# Altium schematic symbol library LATTICEPLDS_Library.SchLib: 291 symbols (part 22 of 32) (continued)
## LFEC1/3/6-T144/TN144 (continued)
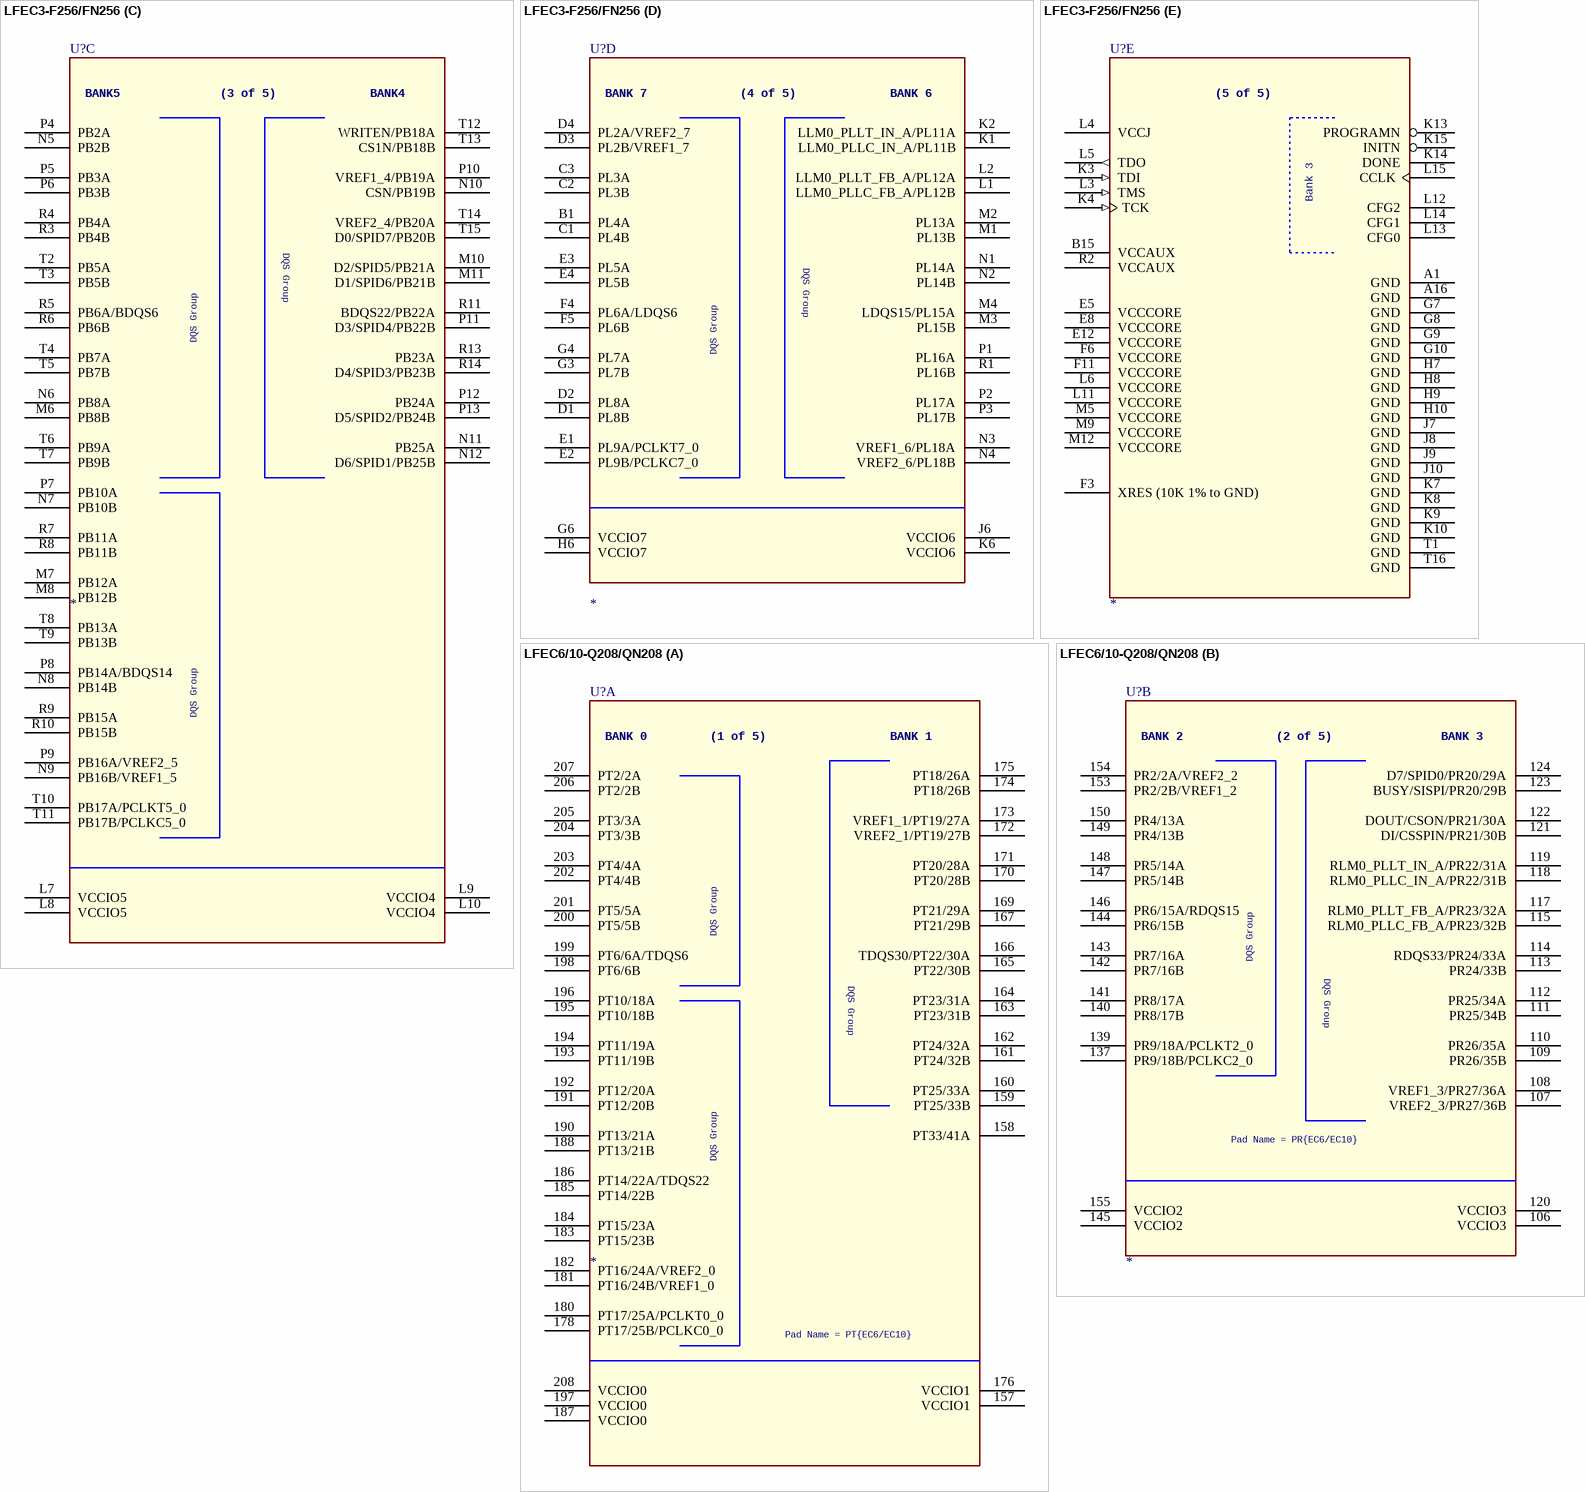
[diagram p208: symbols LFEC3-F256/FN256 to LFEC6/10-Q208/QN208]
part A text: BANK 0; (1 OF 5); BANK 1; Pad name = PT{EC1/EC3/EC6}
part B text: BANK 2; (2 OF 5); BANK 3; Pad name = PR{EC1/EC3/EC6}
part C text: BANK 5; (3 OF 5); BANK 4; Pad name = PB{EC1/EC3/EC6}
part D text: BANK 7; (4 OF 5); BANK 6; Pad name = PL{EC1/EC3/EC6}
part E text: (5 OF 5); Bank 3; 11 and 12 are N/C for EC1 and EC3

## LFEC3-F256/FN256
designator U?
footprint fpBGA256
part A pins: A2 PT5A, A3 PT5B, A4 PT6A/TDQS6, A5 PT6B, A6 PT10A, A7 PT10B, A8 PT13A, A9 PT13B, A10 PT17B/PCLKC0_0, A11 PT18B, A12 VREF2_1/PT19B, A13 PT21A, A14 PT21B, A15 PT24B, B2 PT4B, B3 PT4A, B4 PT2A, B5 PT7A, B6 PT7B, B7 PT12A, B8 PT12B, B9 PT16A/VREF2_0, B10 PT17A/PCLKT0_0, B11 PT18A, B12 VREF1_1/PT19A, B14 PT24A, C4 PT2B, C5 PT3A, C6 PT8A, C7 PT11A, C8 PT14A/TDQS14, C9 PT16B/VREF1_0, C10 PT20A, C11 PT23A, C12 PT25B, D5 PT3B, D6 PT8B, D7 PT11B, D8 PT14B, D9 PT15A, D10 PT20B, D11 PT23B, D12 PT25A, E6 PT9A, E7 PT9B, E9 PT15B, E10 PT22B, E11 TDQS22/PT22A, F7 VCCIO0 (power), F8 VCCIO0 (power), F9 VCCIO1 (power), F10 VCCIO1 (power)
part B pins: B16 PR4A, C14 PR3A, C15 PR3B, C16 PR4B, D13 PR2A/VREF2_2, D14 PR2B/VREF1_2, D15 PR6A/RDQS6, D16 PR6B, E13 PR7A, E14 PR5A, F12 PR7B, F13 PR8A, F14 PR5B, G11 VCCIO2 (power), G12 PR9A/PCLKT2_0, G13 PR8B, H11 VCCIO2 (power), H12 PR9B/PCLKC2_0, J11 VCCIO3 (power), J16 D7/SPID0/PR11A, K11 VCCIO3 (power), K16 BUSY/SISPI/PR11B, L16 DOUT/CSON/PR12A, M13 PR15B, M14 RDQS15/PR15A, M15 RLM0_PLLT_IN_A/PR13A, M16 DI/CSSPIN/PR12B, N13 VREF2_3/PR18B, N14 VREF1_3/PR18A, N15 RLM0_PLLC_IN_A/PR13B, N16 RLM0_PLLT_FB_A/PR14A, P14 PR17B, P15 PR17A, P16 RLM0_PLLC_FB_A/PR14B, R15 PR16B, R16 PR16A
part C pins: L7 VCCIO5 (power), L8 VCCIO5 (power), L9 VCCIO4 (power), L10 VCCIO4 (power), M6 PB8B, M7 PB12A, M8 PB12B, M10 D2/SPID5/PB21A, M11 D1/SPID6/PB21B, N5 PB2B, N6 PB8A, N7 PB10B, N8 PB14B, N9 PB16B/VREF1_5, N10 CSN/PB19B, N11 PB25A, N12 D6/SPID1/PB25B, P4 PB2A, P5 PB3A, P6 PB3B, P7 PB10A, P8 PB14A/BDQS14, P9 PB16A/VREF2_5, P10 VREF1_4/PB19A, P11 D3/SPID4/PB22B, P12 PB24A, P13 D5/SPID2/PB24B, R3 PB4B, R4 PB4A, R5 PB6A/BDQS6, R6 PB6B, R7 PB11A, R8 PB11B, R9 PB15A, R10 PB15B, R11 BDQS22/PB22A, R13 PB23A, R14 D4/SPID3/PB23B, T2 PB5A, T3 PB5B, T4 PB7A, T5 PB7B, T6 PB9A, T7 PB9B, T8 PB13A, T9 PB13B, T10 PB17A/PCLKT5_0, T11 PB17B/PCLKC5_0, T12 WRITEN/PB18A, T13 CS1N/PB18B, T14 VREF2_4/PB20A, T15 D0/SPID7/PB20B
part D pins: B1 PL4A, C1 PL4B, C2 PL3B, C3 PL3A, D1 PL8B, D2 PL8A, D3 PL2B/VREF1_7, D4 PL2A/VREF2_7, E1 PL9A/PCLKT7_0, E2 PL9B/PCLKC7_0, E3 PL5A, E4 PL5B, F4 PL6A/LDQS6, F5 PL6B, G3 PL7B, G4 PL7A, G6 VCCIO7 (power), H6 VCCIO7 (power), J6 VCCIO6 (power), K1 LLM0_PLLC_IN_A/PL11B, K2 LLM0_PLLT_IN_A/PL11A, K6 VCCIO6 (power), L1 LLM0_PLLC_FB_A/PL12B, L2 LLM0_PLLT_FB_A/PL12A, M1 PL13B, M2 PL13A, M3 PL15B, M4 LDQS15/PL15A, N1 PL14A, N2 PL14B, N3 VREF1_6/PL18A, N4 VREF2_6/PL18B, P1 PL16A, P2 PL17A, P3 PL17B, R1 PL16B
part E pins: A1 GND (power), A16 GND (power), B15 VCCAUX (power), E5 VCCCORE (power), E8 VCCCORE (power), E12 VCCCORE (power), F3 XRES (10K 1% to GND), F6 VCCCORE (power), F11 VCCCORE (power), G7 GND (power), G8 GND (power), G9 GND (power), G10 GND (power), H7 GND (power), H8 GND (power), H9 GND (power), H10 GND (power), J7 GND (power), J8 GND (power), J9 GND (power), J10 GND (power), K3 TDI (in), K4 TCK (in), K7 GND (power), K8 GND (power), K9 GND (power), K10 GND (power), K13 PROGRAMN, K14 DONE, K15 INITN, L3 TMS (in), L4 VCCJ (power), L5 TDO (out), L6 VCCCORE (power), L11 VCCCORE (power), L12 CFG2, L13 CFG0, L14 CFG1, L15 CCLK, M5 VCCCORE (power), M9 VCCCORE (power), M12 VCCCORE (power), R2 VCCAUX (power), T1 GND (power), T16 GND (power)
part A text: BANK 0; (1 of 5); BANK 1; DQS Group
part B text: BANK 2; (2 of 5); BANK 3; DQS Group
part C text: BANK5; (3 of 5); BANK4; DQS Group
part D text: BANK 7; (4 of 5); BANK 6; DQS Group
part E text: (5 of 5); Bank 3

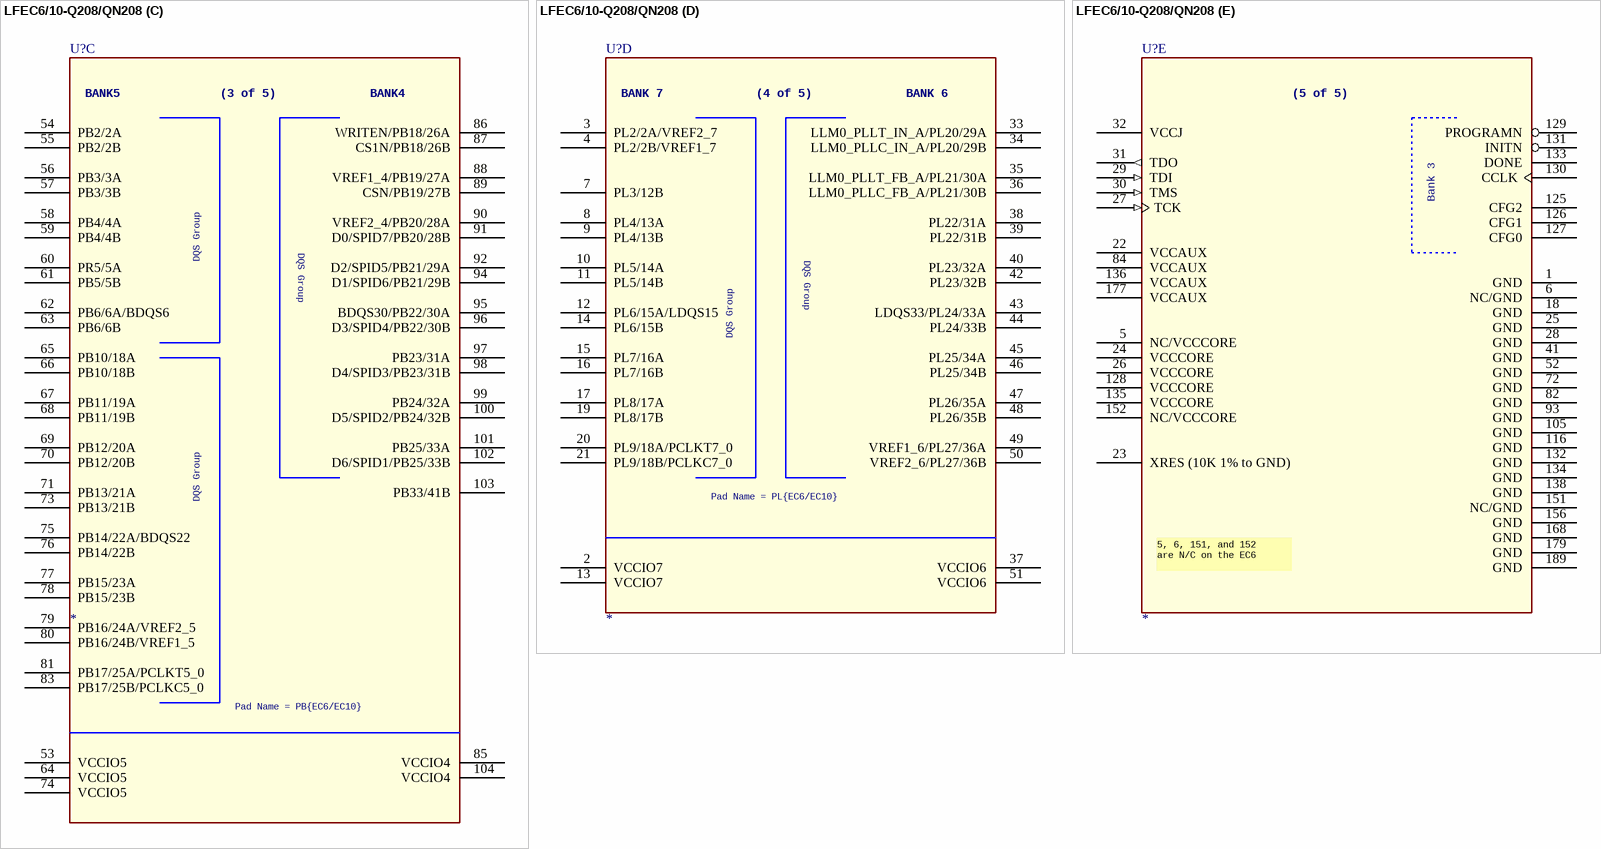
[diagram p209: symbol LFEC6/10-Q208/QN208]

## LFEC6/10-Q208/QN208
designator U?
footprint 208PQFP
part A pins: 157 VCCIO1 (power), 158 PT33/41A, 159 PT25/33B, 160 PT25/33A, 161 PT24/32B, 162 PT24/32A, 163 PT23/31B, 164 PT23/31A, 165 PT22/30B, 166 TDQS30/PT22/30A, 167 PT21/29B, 169 PT21/29A, 170 PT20/28B, 171 PT20/28A, 172 VREF2_1/PT19/27B, 173 VREF1_1/PT19/27A, 174 PT18/26B, 175 PT18/26A, 176 VCCIO1 (power), 178 PT17/25B/PCLKC0_0, 180 PT17/25A/PCLKT0_0, 181 PT16/24B/VREF1_0, 182 PT16/24A/VREF2_0, 183 PT15/23B, 184 PT15/23A, 185 PT14/22B, 186 PT14/22A/TDQS22, 187 VCCIO0 (power), 188 PT13/21B, 190 PT13/21A, 191 PT12/20B, 192 PT12/20A, 193 PT11/19B, 194 PT11/19A, 195 PT10/18B, 196 PT10/18A, 197 VCCIO0 (power), 198 PT6/6B, 199 PT6/6A/TDQS6, 200 PT5/5B, 201 PT5/5A, 202 PT4/4B, 203 PT4/4A, 204 PT3/3B, 205 PT3/3A, 206 PT2/2B, 207 PT2/2A, 208 VCCIO0 (power)
part B pins: 106 VCCIO3 (power), 107 VREF2_3/PR27/36B, 108 VREF1_3/PR27/36A, 109 PR26/35B, 110 PR26/35A, 111 PR25/34B, 112 PR25/34A, 113 PR24/33B, 114 RDQS33/PR24/33A, 115 RLM0_PLLC_FB_A/PR23/32B, 117 RLM0_PLLT_FB_A/PR23/32A, 118 RLM0_PLLC_IN_A/PR22/31B, 119 RLM0_PLLT_IN_A/PR22/31A, 120 VCCIO3 (power), 121 DI/CSSPIN/PR21/30B, 122 DOUT/CSON/PR21/30A, 123 BUSY/SISPI/PR20/29B, 124 D7/SPID0/PR20/29A, 137 PR9/18B/PCLKC2_0, 139 PR9/18A/PCLKT2_0, 140 PR8/17B, 141 PR8/17A, 142 PR7/16B, 143 PR7/16A, 144 PR6/15B, 145 VCCIO2 (power), 146 PR6/15A/RDQS15, 147 PR5/14B, 148 PR5/14A, 149 PR4/13B, 150 PR4/13A, 153 PR2/2B/VREF1_2, 154 PR2/2A/VREF2_2, 155 VCCIO2 (power)
part C pins: 53 VCCIO5 (power), 54 PB2/2A, 55 PB2/2B, 56 PB3/3A, 57 PB3/3B, 58 PB4/4A, 59 PB4/4B, 60 PR5/5A, 61 PB5/5B, 62 PB6/6A/BDQS6, 63 PB6/6B, 64 VCCIO5 (power), 65 PB10/18A, 66 PB10/18B, 67 PB11/19A, 68 PB11/19B, 69 PB12/20A, 70 PB12/20B, 71 PB13/21A, 73 PB13/21B, 74 VCCIO5 (power), 75 PB14/22A/BDQS22, 76 PB14/22B, 77 PB15/23A, 78 PB15/23B, 79 PB16/24A/VREF2_5, 80 PB16/24B/VREF1_5, 81 PB17/25A/PCLKT5_0, 83 PB17/25B/PCLKC5_0, 85 VCCIO4 (power), 86 WRITEN/PB18/26A, 87 CS1N/PB18/26B, 88 VREF1_4/PB19/27A, 89 CSN/PB19/27B, 90 VREF2_4/PB20/28A, 91 D0/SPID7/PB20/28B, 92 D2/SPID5/PB21/29A, 94 D1/SPID6/PB21/29B, 95 BDQS30/PB22/30A, 96 D3/SPID4/PB22/30B, 97 PB23/31A, 98 D4/SPID3/PB23/31B, 99 PB24/32A, 100 D5/SPID2/PB24/32B, 101 PB25/33A, 102 D6/SPID1/PB25/33B, 103 PB33/41B, 104 VCCIO4 (power)
part D pins: 2 VCCIO7 (power), 3 PL2/2A/VREF2_7, 4 PL2/2B/VREF1_7, 7 PL3/12B, 8 PL4/13A, 9 PL4/13B, 10 PL5/14A, 11 PL5/14B, 12 PL6/15A/LDQS15, 13 VCCIO7 (power), 14 PL6/15B, 15 PL7/16A, 16 PL7/16B, 17 PL8/17A, 19 PL8/17B, 20 PL9/18A/PCLKT7_0, 21 PL9/18B/PCLKC7_0, 33 LLM0_PLLT_IN_A/PL20/29A, 34 LLM0_PLLC_IN_A/PL20/29B, 35 LLM0_PLLT_FB_A/PL21/30A, 36 LLM0_PLLC_FB_A/PL21/30B, 37 VCCIO6 (power), 38 PL22/31A, 39 PL22/31B, 40 PL23/32A, 42 PL23/32B, 43 LDQS33/PL24/33A, 44 PL24/33B, 45 PL25/34A, 46 PL25/34B, 47 PL26/35A, 48 PL26/35B, 49 VREF1_6/PL27/36A, 50 VREF2_6/PL27/36B, 51 VCCIO6 (power)
part E pins: 1 GND (power), 5 NC/VCCCORE (power), 6 NC/GND (power), 18 GND (power), 22 VCCAUX (power), 23 XRES (10K 1% to GND), 24 VCCCORE (power), 25 GND (power), 26 VCCCORE (power), 27 TCK (in), 28 GND (power), 29 TDI (in), 30 TMS (in), 31 TDO (out), 32 VCCJ (power), 41 GND (power), 52 GND (power), 72 GND (power), 82 GND (power), 84 VCCAUX (power), 93 GND (power), 105 GND (power), 116 GND (power), 125 CFG2, 126 CFG1, 127 CFG0, 128 VCCCORE (power), 129 PROGRAMN, 130 CCLK, 131 INITN, 132 GND (power), 133 DONE, 134 GND (power), 135 VCCCORE (power), 136 VCCAUX (power), 138 GND (power), 151 NC/GND (power), 152 NC/VCCCORE (power), 156 GND (power), 168 GND (power), 177 VCCAUX (power), 179 GND (power), 189 GND (power)
part A text: BANK 0; (1 of 5); BANK 1; DQS Group; Pad Name = PT{EC6/EC10}
part B text: BANK 2; (2 of 5); BANK 3; DQS Group; Pad Name = PR{EC6/EC10}
part C text: BANK5; (3 of 5); BANK4; DQS Group; Pad Name = PB{EC6/EC10}
part D text: BANK 7; (4 of 5); BANK 6; DQS Group; Pad Name = PL{EC6/EC10}
part E text: (5 of 5); Bank 3; 5, 6, 151, and 152 / are N/C on the EC6

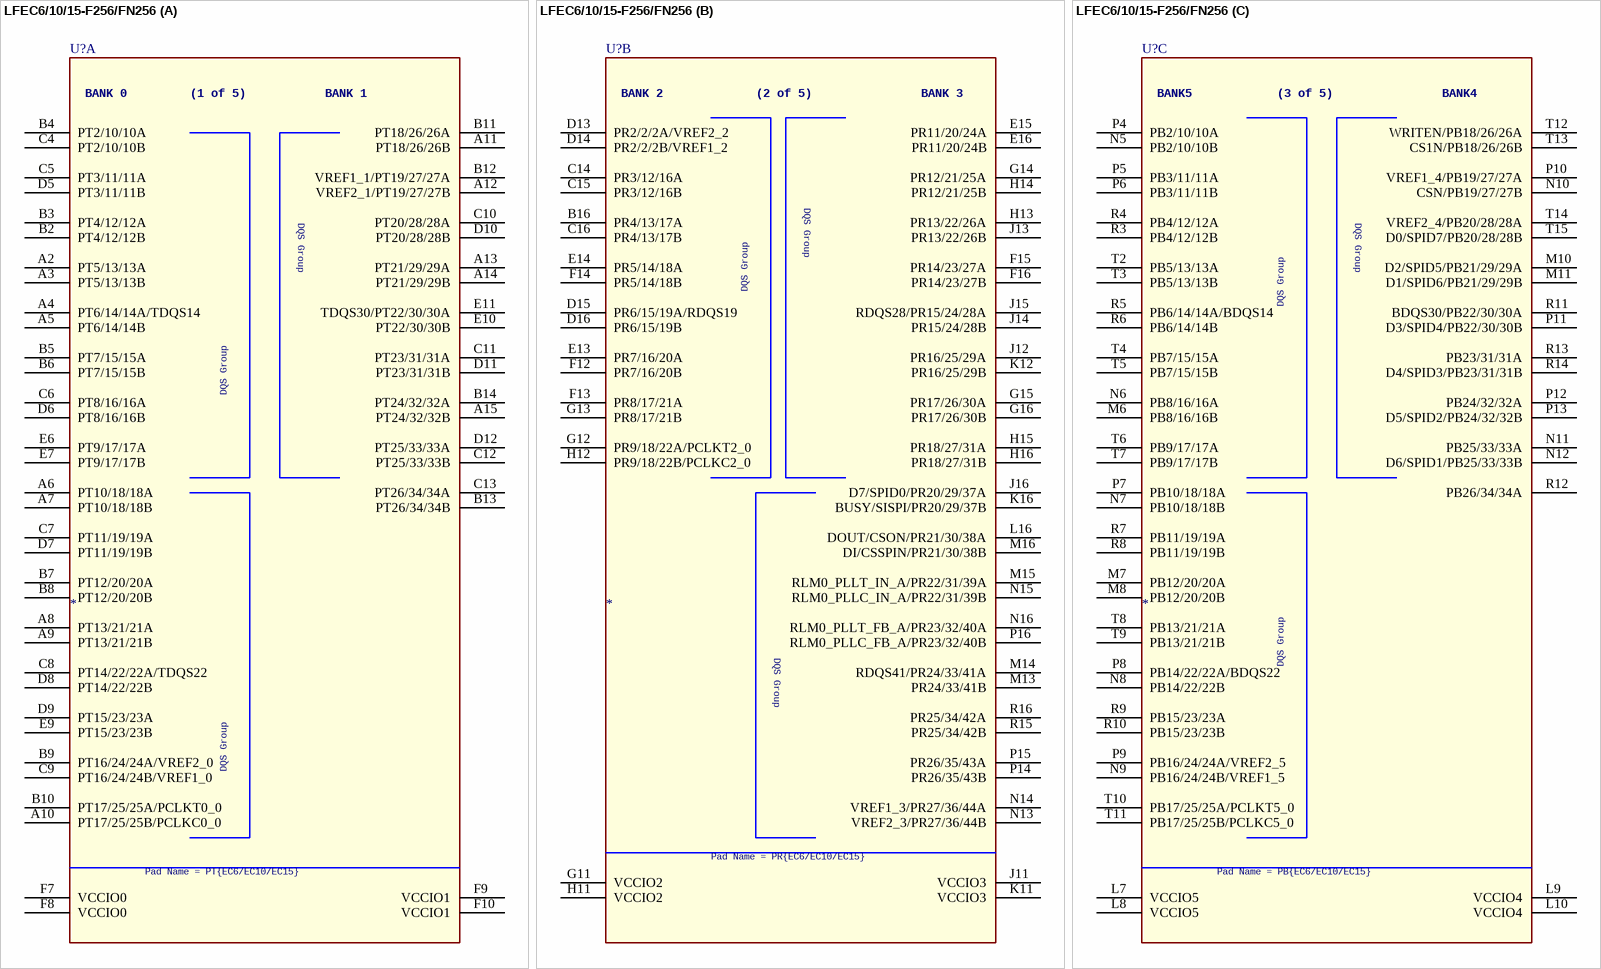
[diagram p210: symbol LFEC6/10/15-F256/FN256]

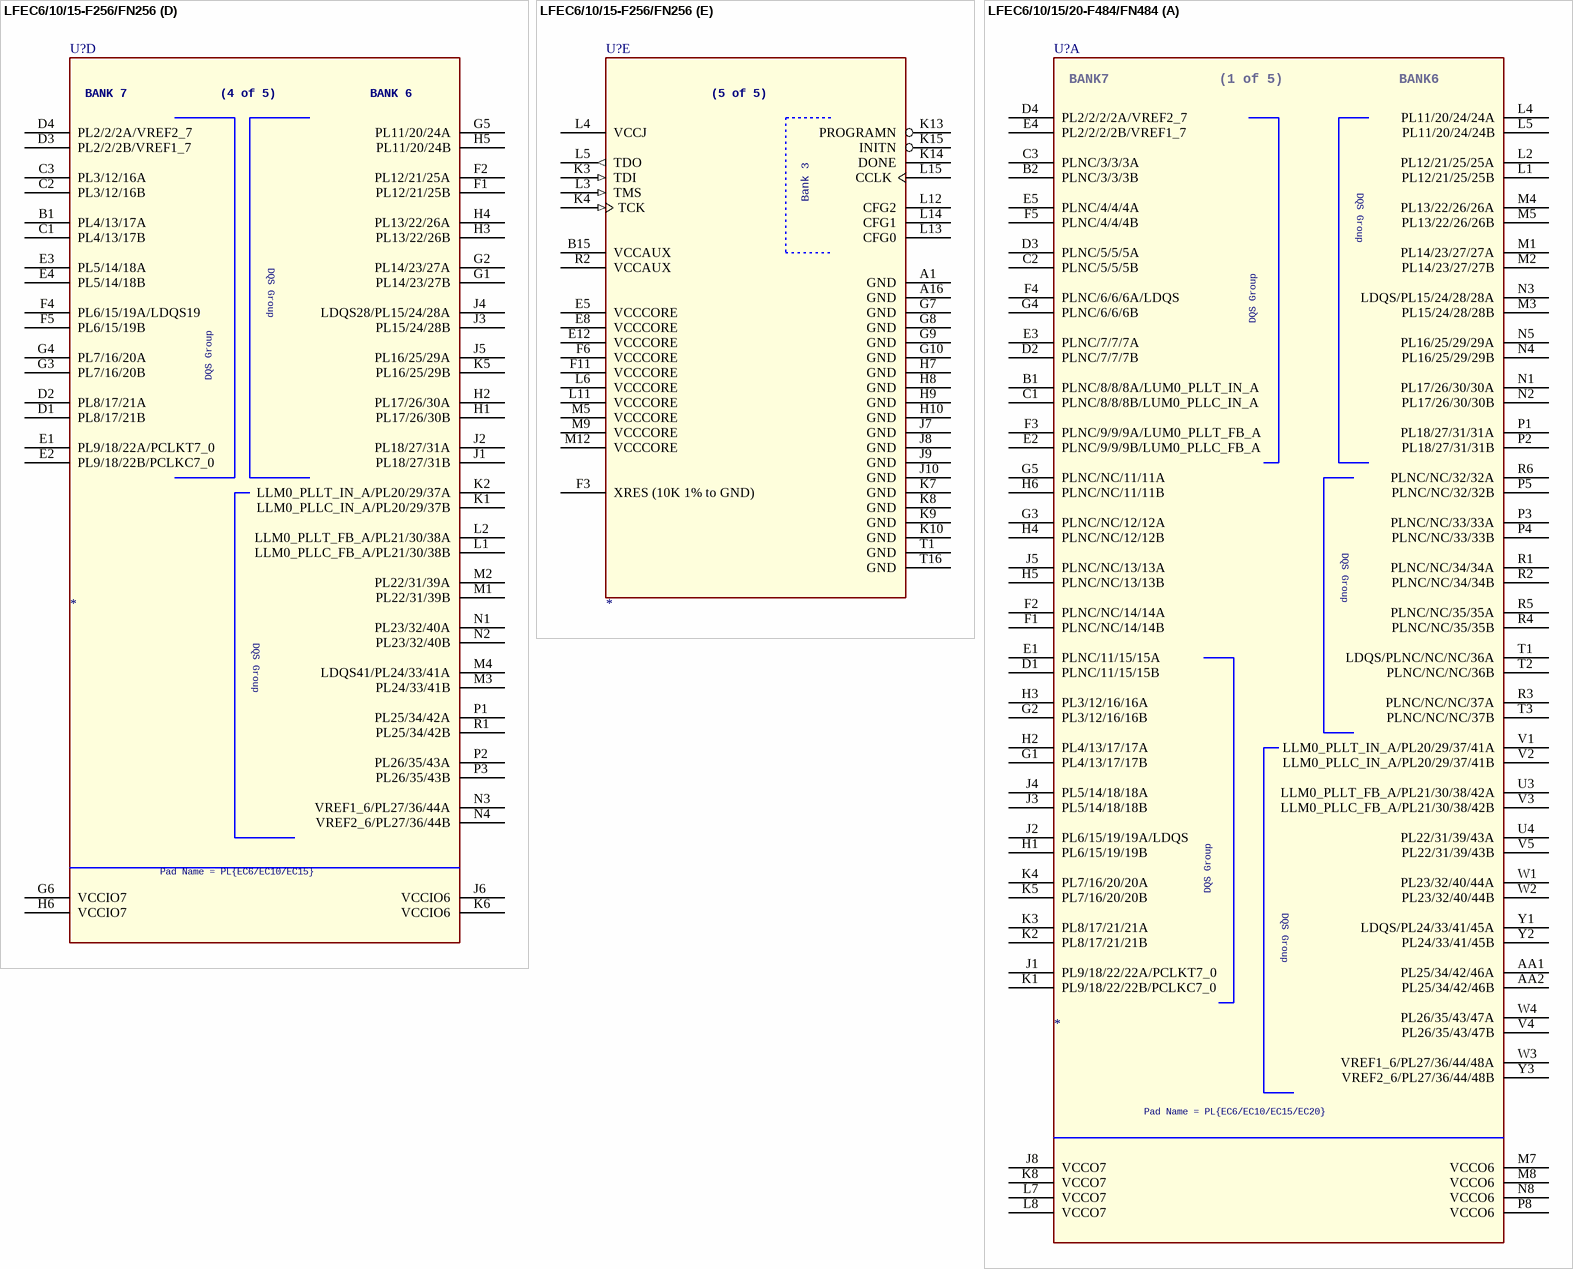
[diagram p211: symbols LFEC6/10/15-F256/FN256 to LFEC6/10/15/20-F484/FN484]

## LFEC6/10/15-F256/FN256
designator U?
footprint fpBGA256
part A pins: A2 PT5/13/13A, A3 PT5/13/13B, A4 PT6/14/14A/TDQS14, A5 PT6/14/14B, A6 PT10/18/18A, A7 PT10/18/18B, A8 PT13/21/21A, A9 PT13/21/21B, A10 PT17/25/25B/PCLKC0_0, A11 PT18/26/26B, A12 VREF2_1/PT19/27/27B, A13 PT21/29/29A, A14 PT21/29/29B, A15 PT24/32/32B, B2 PT4/12/12B, B3 PT4/12/12A, B4 PT2/10/10A, B5 PT7/15/15A, B6 PT7/15/15B, B7 PT12/20/20A, B8 PT12/20/20B, B9 PT16/24/24A/VREF2_0, B10 PT17/25/25A/PCLKT0_0, B11 PT18/26/26A, B12 VREF1_1/PT19/27/27A, B13 PT26/34/34B, B14 PT24/32/32A, C4 PT2/10/10B, C5 PT3/11/11A, C6 PT8/16/16A, C7 PT11/19/19A, C8 PT14/22/22A/TDQS22, C9 PT16/24/24B/VREF1_0, C10 PT20/28/28A, C11 PT23/31/31A, C12 PT25/33/33B, C13 PT26/34/34A, D5 PT3/11/11B, D6 PT8/16/16B, D7 PT11/19/19B, D8 PT14/22/22B, D9 PT15/23/23A, D10 PT20/28/28B, D11 PT23/31/31B, D12 PT25/33/33A, E6 PT9/17/17A, E7 PT9/17/17B, E9 PT15/23/23B, E10 PT22/30/30B, E11 TDQS30/PT22/30/30A, F7 VCCIO0 (power), F8 VCCIO0 (power), F9 VCCIO1 (power), F10 VCCIO1 (power)
part B pins: B16 PR4/13/17A, C14 PR3/12/16A, C15 PR3/12/16B, C16 PR4/13/17B, D13 PR2/2/2A/VREF2_2, D14 PR2/2/2B/VREF1_2, D15 PR6/15/19A/RDQS19, D16 PR6/15/19B, E13 PR7/16/20A, E14 PR5/14/18A, E15 PR11/20/24A, E16 PR11/20/24B, F12 PR7/16/20B, F13 PR8/17/21A, F14 PR5/14/18B, F15 PR14/23/27A, F16 PR14/23/27B, G11 VCCIO2 (power), G12 PR9/18/22A/PCLKT2_0, G13 PR8/17/21B, G14 PR12/21/25A, G15 PR17/26/30A, G16 PR17/26/30B, H11 VCCIO2 (power), H12 PR9/18/22B/PCLKC2_0, H13 PR13/22/26A, H14 PR12/21/25B, H15 PR18/27/31A, H16 PR18/27/31B, J11 VCCIO3 (power), J12 PR16/25/29A, J13 PR13/22/26B, J14 PR15/24/28B, J15 RDQS28/PR15/24/28A, J16 D7/SPID0/PR20/29/37A, K11 VCCIO3 (power), K12 PR16/25/29B, K16 BUSY/SISPI/PR20/29/37B, L16 DOUT/CSON/PR21/30/38A, M13 PR24/33/41B, M14 RDQS41/PR24/33/41A, M15 RLM0_PLLT_IN_A/PR22/31/39A, M16 DI/CSSPIN/PR21/30/38B, N13 VREF2_3/PR27/36/44B, N14 VREF1_3/PR27/36/44A, N15 RLM0_PLLC_IN_A/PR22/31/39B, N16 RLM0_PLLT_FB_A/PR23/32/40A, P14 PR26/35/43B, P15 PR26/35/43A, P16 RLM0_PLLC_FB_A/PR23/32/40B, R15 PR25/34/42B, R16 PR25/34/42A
part C pins: L7 VCCIO5 (power), L8 VCCIO5 (power), L9 VCCIO4 (power), L10 VCCIO4 (power), M6 PB8/16/16B, M7 PB12/20/20A, M8 PB12/20/20B, M10 D2/SPID5/PB21/29/29A, M11 D1/SPID6/PB21/29/29B, N5 PB2/10/10B, N6 PB8/16/16A, N7 PB10/18/18B, N8 PB14/22/22B, N9 PB16/24/24B/VREF1_5, N10 CSN/PB19/27/27B, N11 PB25/33/33A, N12 D6/SPID1/PB25/33/33B, P4 PB2/10/10A, P5 PB3/11/11A, P6 PB3/11/11B, P7 PB10/18/18A, P8 PB14/22/22A/BDQS22, P9 PB16/24/24A/VREF2_5, P10 VREF1_4/PB19/27/27A, P11 D3/SPID4/PB22/30/30B, P12 PB24/32/32A, P13 D5/SPID2/PB24/32/32B, R3 PB4/12/12B, R4 PB4/12/12A, R5 PB6/14/14A/BDQS14, R6 PB6/14/14B, R7 PB11/19/19A, R8 PB11/19/19B, R9 PB15/23/23A, R10 PB15/23/23B, R11 BDQS30/PB22/30/30A, R12 PB26/34/34A, R13 PB23/31/31A, R14 D4/SPID3/PB23/31/31B, T2 PB5/13/13A, T3 PB5/13/13B, T4 PB7/15/15A, T5 PB7/15/15B, T6 PB9/17/17A, T7 PB9/17/17B, T8 PB13/21/21A, T9 PB13/21/21B, T10 PB17/25/25A/PCLKT5_0, T11 PB17/25/25B/PCLKC5_0, T12 WRITEN/PB18/26/26A, T13 CS1N/PB18/26/26B, T14 VREF2_4/PB20/28/28A, T15 D0/SPID7/PB20/28/28B
part D pins: B1 PL4/13/17A, C1 PL4/13/17B, C2 PL3/12/16B, C3 PL3/12/16A, D1 PL8/17/21B, D2 PL8/17/21A, D3 PL2/2/2B/VREF1_7, D4 PL2/2/2A/VREF2_7, E1 PL9/18/22A/PCLKT7_0, E2 PL9/18/22B/PCLKC7_0, E3 PL5/14/18A, E4 PL5/14/18B, F1 PL12/21/25B, F2 PL12/21/25A, F4 PL6/15/19A/LDQS19, F5 PL6/15/19B, G1 PL14/23/27B, G2 PL14/23/27A, G3 PL7/16/20B, G4 PL7/16/20A, G5 PL11/20/24A, G6 VCCIO7 (power), H1 PL17/26/30B, H2 PL17/26/30A, H3 PL13/22/26B, H4 PL13/22/26A, H5 PL11/20/24B, H6 VCCIO7 (power), J1 PL18/27/31B, J2 PL18/27/31A, J3 PL15/24/28B, J4 LDQS28/PL15/24/28A, J5 PL16/25/29A, J6 VCCIO6 (power), K1 LLM0_PLLC_IN_A/PL20/29/37B, K2 LLM0_PLLT_IN_A/PL20/29/37A, K5 PL16/25/29B, K6 VCCIO6 (power), L1 LLM0_PLLC_FB_A/PL21/30/38B, L2 LLM0_PLLT_FB_A/PL21/30/38A, M1 PL22/31/39B, M2 PL22/31/39A, M3 PL24/33/41B, M4 LDQS41/PL24/33/41A, N1 PL23/32/40A, N2 PL23/32/40B, N3 VREF1_6/PL27/36/44A, N4 VREF2_6/PL27/36/44B, P1 PL25/34/42A, P2 PL26/35/43A, P3 PL26/35/43B, R1 PL25/34/42B
part E pins: A1 GND (power), A16 GND (power), B15 VCCAUX (power), E5 VCCCORE (power), E8 VCCCORE (power), E12 VCCCORE (power), F3 XRES (10K 1% to GND), F6 VCCCORE (power), F11 VCCCORE (power), G7 GND (power), G8 GND (power), G9 GND (power), G10 GND (power), H7 GND (power), H8 GND (power), H9 GND (power), H10 GND (power), J7 GND (power), J8 GND (power), J9 GND (power), J10 GND (power), K3 TDI (in), K4 TCK (in), K7 GND (power), K8 GND (power), K9 GND (power), K10 GND (power), K13 PROGRAMN, K14 DONE, K15 INITN, L3 TMS (in), L4 VCCJ (power), L5 TDO (out), L6 VCCCORE (power), L11 VCCCORE (power), L12 CFG2, L13 CFG0, L14 CFG1, L15 CCLK, M5 VCCCORE (power), M9 VCCCORE (power), M12 VCCCORE (power), R2 VCCAUX (power), T1 GND (power), T16 GND (power)
part A text: BANK 0; (1 of 5); BANK 1; DQS Group; Pad Name = PT{EC6/EC10/EC15}
part B text: BANK 2; (2 of 5); BANK 3; DQS Group; Pad Name = PR{EC6/EC10/EC15}
part C text: BANK5; (3 of 5); BANK4; DQS Group; Pad Name = PB{EC6/EC10/EC15}
part D text: BANK 7; (4 of 5); BANK 6; DQS Group; Pad Name = PL{EC6/EC10/EC15}
part E text: (5 of 5); Bank 3

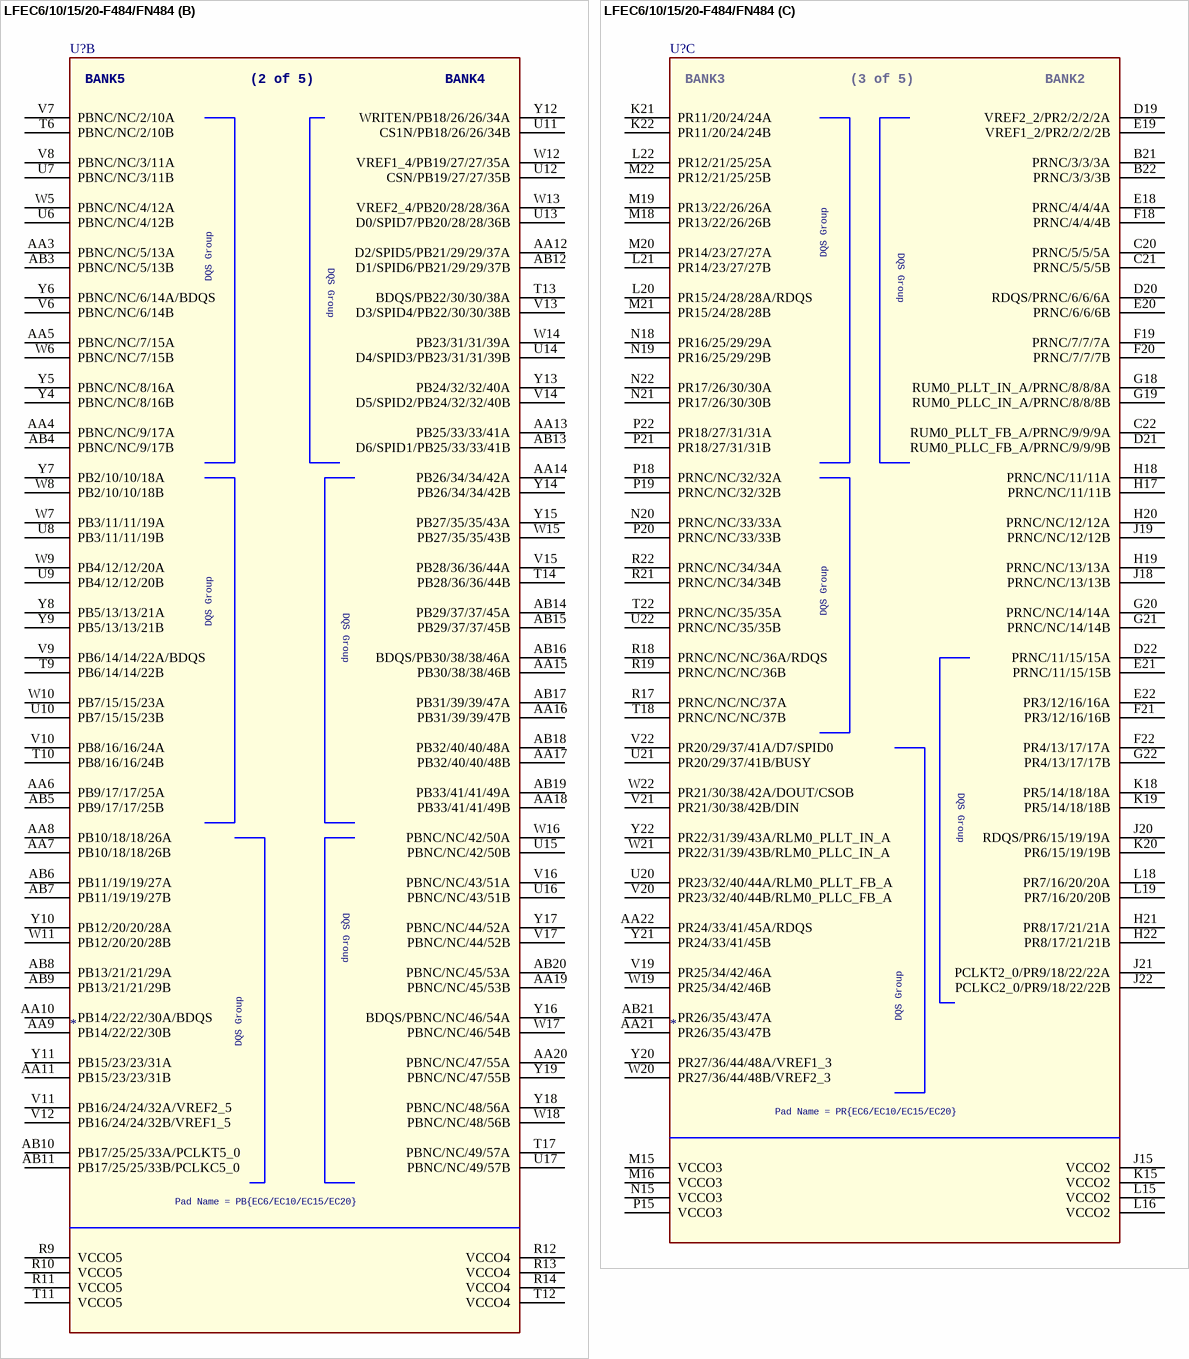
[diagram p212: symbol LFEC6/10/15/20-F484/FN484]

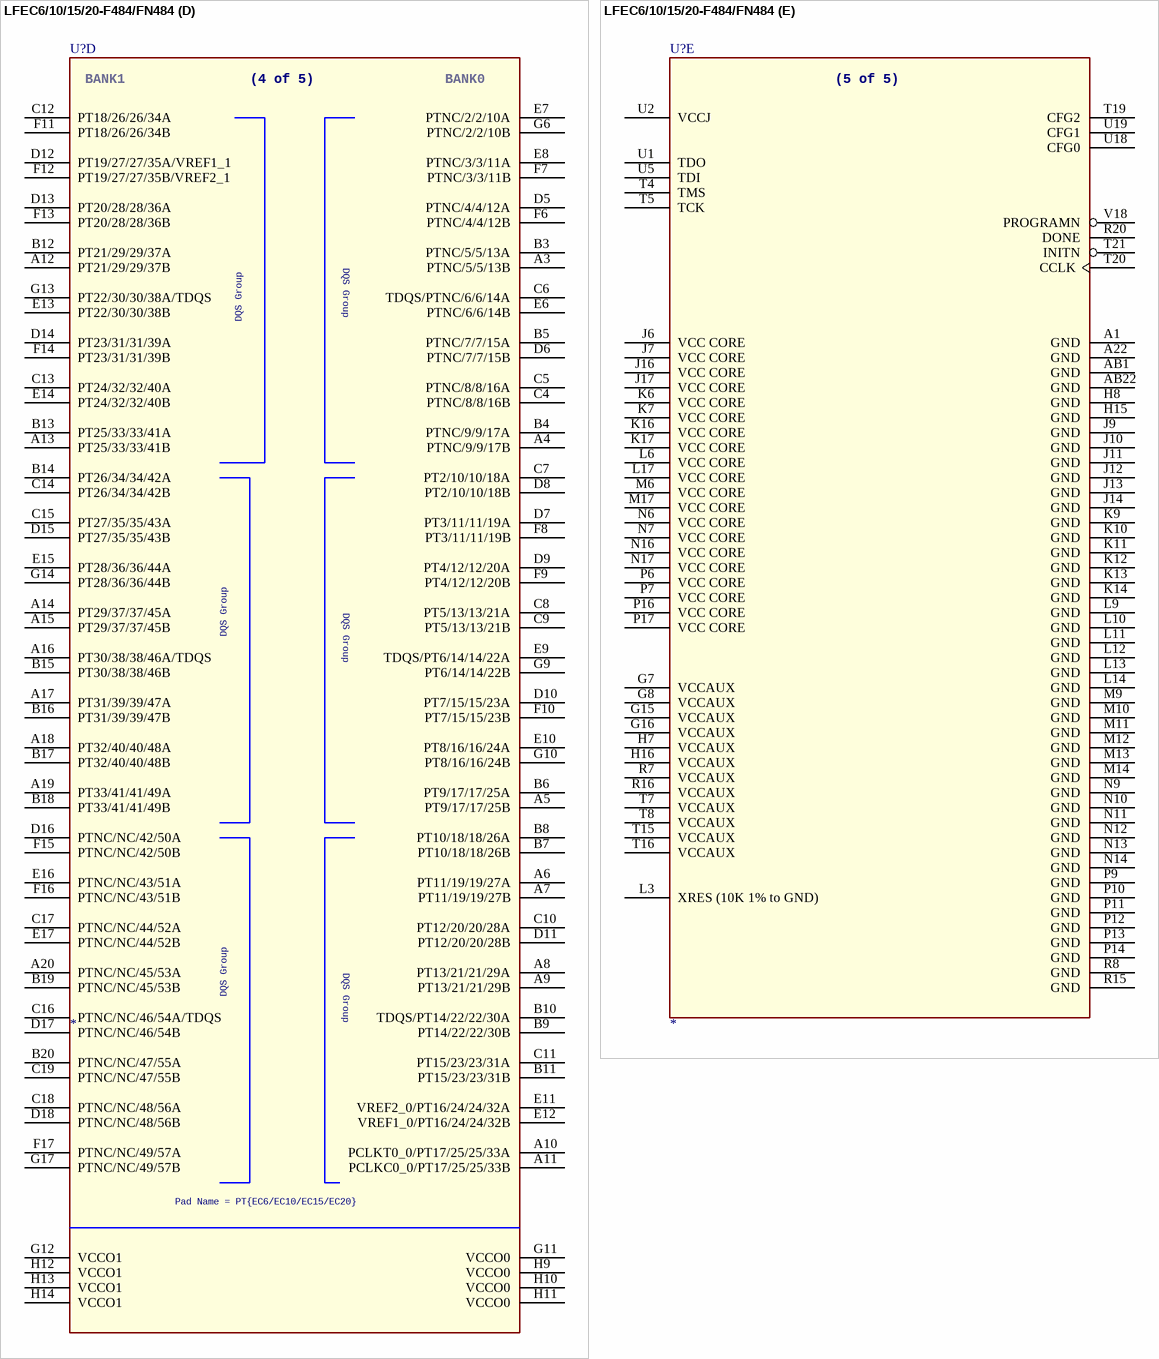
[diagram p213: symbol LFEC6/10/15/20-F484/FN484]
